# Altium footprint library XU-GENARAL PCB .PcbLib: 1176 footprints (part 67 of 75)
Each footprint in its own frame and in the unit in brackets; x right, y up, seen from the top. Pads: shape width x height; smd on the part's side, far side on the other; paste and mask are expansions set on the pad; w line width, h text height; cw(c..) or ccw(c..) is an arc to the next point about the centre after c.
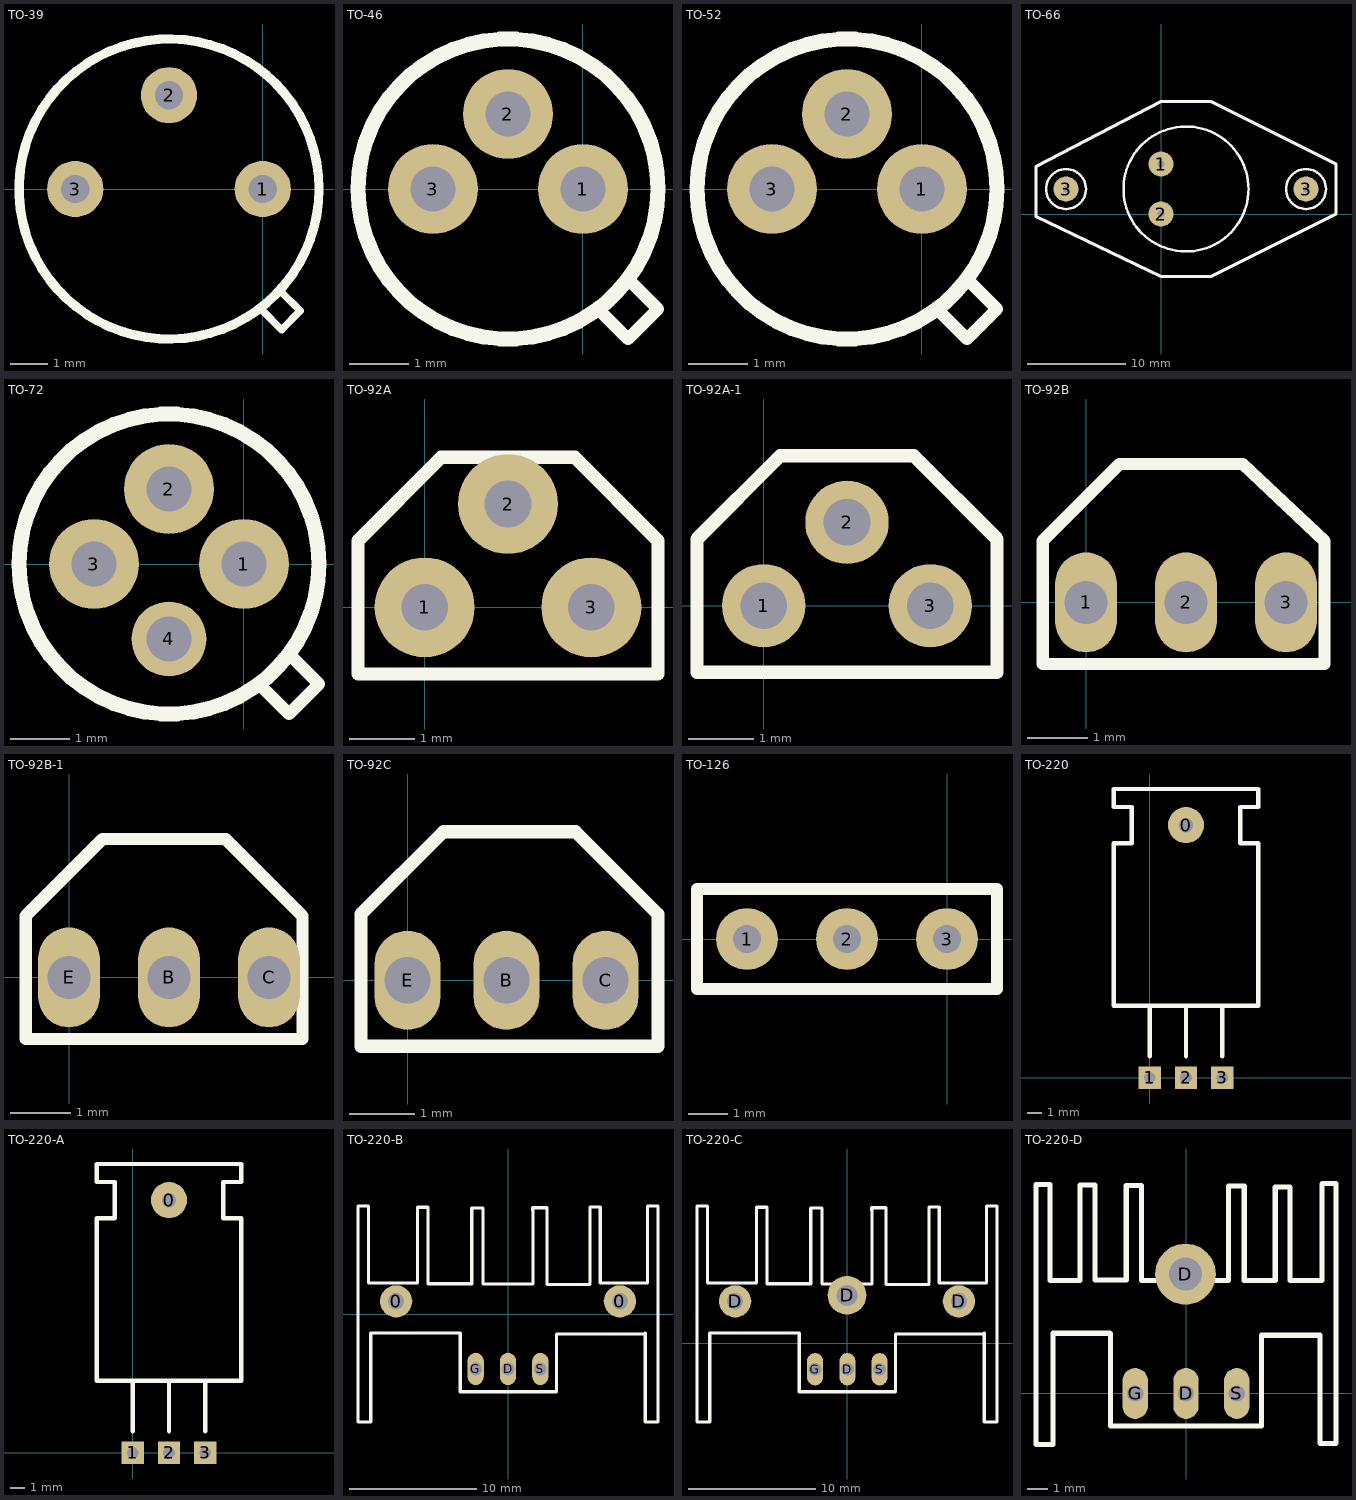
[diagram p66: the footprints below, top view; thin cyan lines are the x and y axes]

## TO-39 [mil]
pads (3):
  round 60 hole 30: 1(0,0) 2(-100,100) 3(-200,0)
Top Overlay:
  circle w10: c-100,0 r160
  lines w8: 0,-130 20,-150 40,-130 20,-110

## TO-46 [mil]
pads (3):
  round 60 hole 30: 1(0,0) 2(-50,50) 3(-100,0)
Top Overlay:
  circle w10: c-50,0 r100
  lines w8: 10,-80 30,-100 50,-80 30,-60

## TO-52 [mil]
pads (3):
  round 60 hole 30: 1(0,0) 2(-50,50) 3(-100,0)
Top Overlay:
  circle w10: c-50,0 r100
  lines w8: 10,-80 30,-100 50,-80 30,-60

## TO-66 [mil]
pads (4):
  round 100 hole 28: 1(0,200) 2(0,0) 3(-380,100) 3(580,100)
Top Overlay:
  circle w10: c580,100 r80
  circle w10: c-380,100 r80
  circle w10: c100,100 r250
  lines w12: -500,-10 0,-250 200,-250 700,0 700,200 200,450 0,450 -500,190 -500,-10

## TO-72 [mil]
pads (4):
  round 60 hole 30: 1(0,0) 2(-50,50) 3(-100,0)
  round 50 hole 30: 4(-50,-50)
Top Overlay:
  circle w10: c-50,0 r100
  lines w8: 10,-80 30,-100 50,-80 30,-60

## TO-92A [mil]
pads (3):
  round 60 hole 28: 1(0,0) 2(50,62) 3(100,0)
Top Overlay:
  lines w8: -40,-40 140,-40 140,40 90,90 10,90 -40,40 -40,-40

## TO-92A-1 [mil]
pads (3):
  round 50 hole 28: 1(0,0) 2(50,50) 3(100,0)
Top Overlay:
  lines w8: -40,-40 140,-40 140,40 90,90 10,90 -40,40 -40,-40

## TO-92B [mil]
pads (3):
  oval 40x65 hole 28: 1(0,0) 2(65,0) 3(130,0)
Top Overlay:
  lines w8: -28.19,-40 -28.19,40 21.81,90 101.81,90 155,40 155,-40 -28.19,-40

## TO-92B-1 [mil]
pads (3):
  oval 40x65 hole 28: B(65,0) C(130,0) E(0,0)
Top Overlay:
  lines w8: -28.19,-40 -28.19,40 21.81,90 101.81,90 151.81,40 151.81,-40 -28.19,-40

## TO-92C [mil]
pads (3):
  oval 40x60 hole 28: B(60,0) C(120,0) E(0,0)
Top Overlay:
  lines w8: -28.19,-40 -28.19,40 21.81,90 101.81,90 151.81,40 151.81,-40 -28.19,-40

## TO-126 [mil]
pads (3):
  round 62 hole 28: 1(-200,0) 2(-100,0) 3(0,0)
Top Overlay:
  lines w12: -250,-50 50,-50 50,50 -250,50 -250,-50

## TO-220 [mil]
pads (4):
  round 100 hole 40: 0(100,700)
  rect 62x62 hole 32: 1(0,0) 2(100,0) 3(200,0)
Top Overlay:
  lines w12: 0,60 0,200 ; 100,60 100,200 ; 200,60 200,200 ; -100,200 -100,650 -50,650 -50,750 -100,750 -100,800 300,800 300,750 250,750 250,650 300,650 300,200 -100,200

## TO-220-A [mil]
pads (4):
  round 100 hole 40: 0(100,700)
  rect 62x62 hole 32: 1(0,0) 2(100,0) 3(200,0)
Top Overlay:
  lines w12: 0,60 0,200 ; 100,60 100,200 ; 200,60 200,200 ; -100,200 300,200 300,650 250,650 250,750 300,750 300,800 -100,800 -100,750 -50,750 -50,650 -100,650 -100,200

## TO-220-B [mil]
pads (5):
  round 100 hole 50: 0(-346.46,39.37) 0(346.46,39.37)
  oval 50x100 hole 40: D(0,-170) G(-100,-170) S(100,-170)
Top Overlay:
  lines w10: -425.2,-59.06 -425.2,-334.65 -464.57,-334.65 -464.57,334.65 -431.65,334.65 -431.65,95.65 -280.65,95.65 -280.65,330.35 -247.65,330.35 -247.65,93.35 -112.35,93.35 -112.35,328.65 -77.65,328.65 -77.65,92.65 77.65,92.65 77.65,319.65 77,320.29 77,329 121,329 121,91 254,91 252,93 ; -425.14,-59 -148,-59 -148,-241 150,-241 150,-62 425.2,-62 ; 254,97 254,331 285.29,331 285.65,331.35 285.65,96.35 431.65,96.35 431.65,334.65 464.57,334.65 464.57,-334.65 425.2,-334.65 425.2,-59.06

## TO-220-C [mil]
pads (6):
  round 100 hole 50: D(-347.46,130.37) D(345.46,130.37)
  round 120 hole 65: D(-1,149)
  oval 50x100 hole 40: D(0,-80) G(-100,-80) S(100,-80)
Top Overlay:
  lines w10: -426.2,31.94 -426.2,-243.65 -465.57,-243.65 -465.57,425.65 -432.65,425.65 -432.65,186.65 -281.65,186.65 -281.65,421.35 -248.65,421.35 -248.65,184.35 -113.35,184.35 -113.35,419.65 -78.65,419.65 -78.65,183.65 76.65,183.65 76.65,410.65 76,411.29 76,420 120,420 120,182 253,182 251,184 ; -426.14,32 -149,32 -149,-150 149,-150 149,29 424.2,29 ; 253,188 253,422 284.29,422 284.65,422.35 284.65,187.35 430.65,187.35 430.65,425.65 463.57,425.65 463.57,-243.65 424.2,-243.65 424.2,31.94

## TO-220-D [mil]
pads (4):
  round 120 hole 65: D(-1,235)
  oval 50x100 hole 32: D(0,0) G(-100,0) S(100,0)
Top Overlay:
  lines w10: -149.57,118.57 -261.57,118.57 -261.57,-100.43 -295.28,-100.43 -295.28,411.39 -267.39,411.39 -267.39,222.39 -208.39,222.39 -208.39,410.61 -179.39,410.61 -179.39,223.39 -117.61,223.39 -117.61,409.61 -87.61,409.61 -87.61,222.39 83.61,222.39 83.61,408.61 114.61,408.61 114.61,222.39 175.61,222.39 175.61,406.61 204.39,406.61 204.39,222.61 267.61,222.61 267.61,412.61 268.39,413.39 295.28,413.39 295.28,-98.43 270.57,-98.43 263.43,-98.43 263.43,114.57 149.43,114.57 ; -149,118 -149,-64 149,-64 149,115